# Altium schematic symbol library jlcpcb_2025_04_capacitors_extended_0805.schlib: 3281 symbols (part 14 of 18)
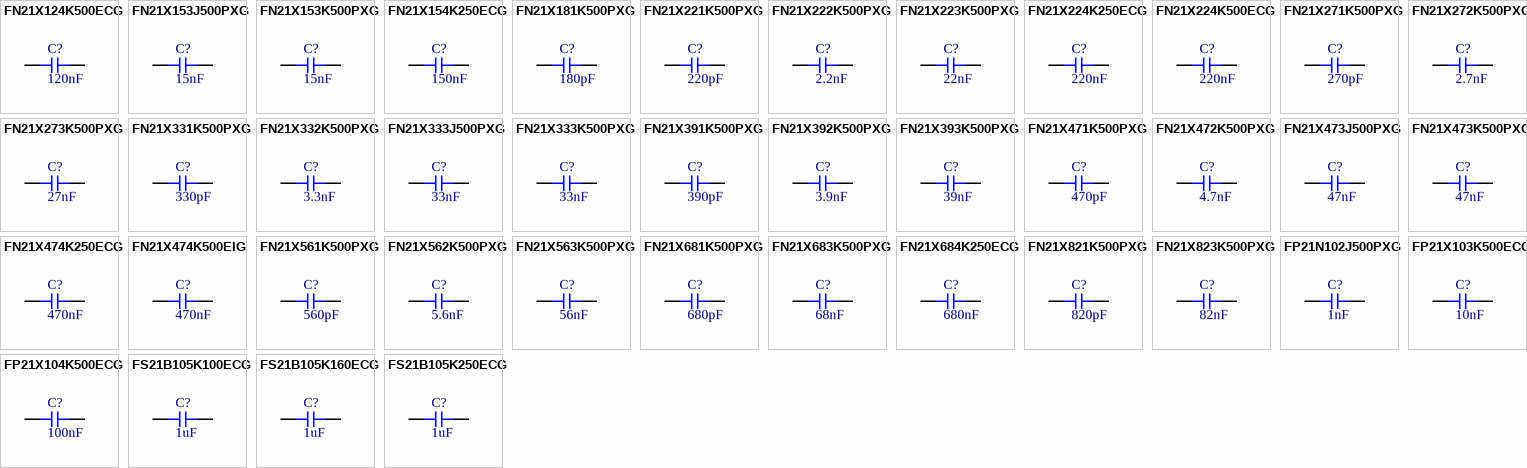
[diagram p95: symbols FN21X124K500ECG to FS21B105K250ECG]

## FN21X821K500PXG
designator C?  Capacitance: 820pF  (hidden comment: *)
Capacitor, Ceramic (MLCC), 820pF, ±10%, 50V, X7R, ±10%, SMD 0805; Manufacturer: PSA(Prosperity Dielectrics); Manufacturer Part Number: FN21X821K500PXG; Package Size: 0805; JLCPCB Basic Part: No; JLCPCB Part Number: C565627; Supplier 1: LCSC; Category: Capacitors - MLCC; Supplier Part Number 1: C565627; Tolerance: ±10%; Voltage Rating: 50V; Temperature Coefficient: X7R; RoHS: Yes; ComponentLink1Description: Datasheet; ComponentLink1URL: https://wmsc.lcsc.com/wmsc/upload/file/pdf/v2/lcsc/2304140030_PSA-Prosperity-Dielectrics-FN21X821K500PXG_C565627.pdf; ComponentLink2Description: JLCPCB Part URL; ComponentLink2URL: https://jlcpcb.com/partdetail/C565627; ComponentLink3Description: LCSC Part URL; ComponentLink3URL: https://lcsc.com/product-detail/Multilayer-Ceramic-Capacitors-MLCC---SMD-SMT_PSAProsperity-Dielectrics-PSAProsperity-Dielectrics-FN21X821K500PXG_C565627.html
footprint CAP-0805 (0805 (2012M) Capacitor)
pins: 1, 2

## FN21X823K500PXG
designator C?  Capacitance: 82nF  (hidden comment: *)
Capacitor, Ceramic (MLCC), 82nF, ±10%, 50V, X7R, ±10%, SMD 0805; Manufacturer: PSA(Prosperity Dielectrics); Manufacturer Part Number: FN21X823K500PXG; Package Size: 0805; JLCPCB Basic Part: No; JLCPCB Part Number: C565629; Supplier 1: LCSC; Category: Capacitors - MLCC; Supplier Part Number 1: C565629; Tolerance: ±10%; Voltage Rating: 50V; Temperature Coefficient: X7R; RoHS: Yes; ComponentLink1Description: Datasheet; ComponentLink1URL: https://wmsc.lcsc.com/wmsc/upload/file/pdf/v2/lcsc/2304140030_PSA-Prosperity-Dielectrics-FN21X823K500PXG_C565629.pdf; ComponentLink2Description: JLCPCB Part URL; ComponentLink2URL: https://jlcpcb.com/partdetail/C565629; ComponentLink3Description: LCSC Part URL; ComponentLink3URL: https://lcsc.com/product-detail/Multilayer-Ceramic-Capacitors-MLCC---SMD-SMT_PSAProsperity-Dielectrics-PSAProsperity-Dielectrics-FN21X823K500PXG_C565629.html
footprint CAP-0805 (0805 (2012M) Capacitor)
pins: 1, 2

## FP21N102J500PXG
designator C?  Capacitance: 1nF  (hidden comment: *)
Capacitor, Ceramic (MLCC), 1nF, ±5%, 50V, C0G, ±5%, SMD 0805; Manufacturer: PSA(Prosperity Dielectrics); Manufacturer Part Number: FP21N102J500PXG; Package Size: 0805; JLCPCB Basic Part: No; JLCPCB Part Number: C525320; Supplier 1: LCSC; Category: Capacitors - MLCC; Supplier Part Number 1: C525320; Tolerance: ±5%; Voltage Rating: 50V; Temperature Coefficient: C0G; RoHS: Yes; ComponentLink1Description: Datasheet; ComponentLink1URL: https://wmsc.lcsc.com/wmsc/upload/file/pdf/v2/lcsc/2304140030_PSA-Prosperity-Dielectrics-FP21N102J500PXG_C525320.pdf; ComponentLink2Description: JLCPCB Part URL; ComponentLink2URL: https://jlcpcb.com/partdetail/C525320; ComponentLink3Description: LCSC Part URL; ComponentLink3URL: https://lcsc.com/product-detail/Multilayer-Ceramic-Capacitors-MLCC---SMD-SMT_PSAProsperity-Dielectrics-PSAProsperity-Dielectrics-FP21N102J500PXG_C525320.html
footprint CAP-0805 (0805 (2012M) Capacitor)
pins: 1, 2

## FP21X103K500ECG
designator C?  Capacitance: 10nF  (hidden comment: *)
Capacitor, Ceramic (MLCC), 10nF, ±10%, 50V, X7R, ±10%, SMD 0805; Manufacturer: PSA(Prosperity Dielectrics); Manufacturer Part Number: FP21X103K500ECG; Package Size: 0805; JLCPCB Basic Part: No; JLCPCB Part Number: C2929180; Supplier 1: LCSC; Category: Capacitors - MLCC; Supplier Part Number 1: C2929180; Tolerance: ±10%; Voltage Rating: 50V; Temperature Coefficient: X7R; RoHS: Yes; ComponentLink1Description: Datasheet; ComponentLink1URL: https://wmsc.lcsc.com/wmsc/upload/file/pdf/v2/lcsc/2201121400_PSA-Prosperity-Dielectrics-FP21X103K500ECG_C2929180.pdf; ComponentLink2Description: JLCPCB Part URL; ComponentLink2URL: https://jlcpcb.com/partdetail/C2929180; ComponentLink3Description: LCSC Part URL; ComponentLink3URL: https://lcsc.com/product-detail/Multilayer-Ceramic-Capacitors-MLCC---SMD-SMT_PSAProsperity-Dielectrics-PSAProsperity-Dielectrics-FP21X103K500ECG_C2929180.html
footprint CAP-0805 (0805 (2012M) Capacitor)
pins: 1, 2

## FP21X104K500ECG
designator C?  Capacitance: 100nF  (hidden comment: *)
Capacitor, Ceramic (MLCC), 100nF, ±10%, 50V, X7R, ±10%, SMD 0805; Manufacturer: PSA(Prosperity Dielectrics); Manufacturer Part Number: FP21X104K500ECG; Package Size: 0805; JLCPCB Basic Part: No; JLCPCB Part Number: C2929181; Supplier 1: LCSC; Category: Capacitors - MLCC; Supplier Part Number 1: C2929181; Tolerance: ±10%; Voltage Rating: 50V; Temperature Coefficient: X7R; RoHS: Yes; ComponentLink1Description: Datasheet; ComponentLink1URL: https://wmsc.lcsc.com/wmsc/upload/file/pdf/v2/lcsc/2201121400_PSA-Prosperity-Dielectrics-FP21X104K500ECG_C2929181.pdf; ComponentLink2Description: JLCPCB Part URL; ComponentLink2URL: https://jlcpcb.com/partdetail/C2929181; ComponentLink3Description: LCSC Part URL; ComponentLink3URL: https://lcsc.com/product-detail/Multilayer-Ceramic-Capacitors-MLCC---SMD-SMT_PSAProsperity-Dielectrics-PSAProsperity-Dielectrics-FP21X104K500ECG_C2929181.html
footprint CAP-0805 (0805 (2012M) Capacitor)
pins: 1, 2

## FS21B105K100ECG
designator C?  Capacitance: 1uF  (hidden comment: *)
Capacitor, Ceramic (MLCC), 1uF, ±10%, 10V, X5R, ±10%, SMD 0805; Manufacturer: PSA(Prosperity Dielectrics); Manufacturer Part Number: FS21B105K100ECG; Package Size: 0805; JLCPCB Basic Part: No; JLCPCB Part Number: C525336; Supplier 1: LCSC; Category: Capacitors - MLCC; Supplier Part Number 1: C525336; Tolerance: ±10%; Voltage Rating: 10V; Temperature Coefficient: X5R; RoHS: Yes; ComponentLink1Description: Datasheet; ComponentLink1URL: https://wmsc.lcsc.com/wmsc/upload/file/pdf/v2/lcsc/2304140030_PSA-Prosperity-Dielectrics-FS21B105K100ECG_C525336.pdf; ComponentLink2Description: JLCPCB Part URL; ComponentLink2URL: https://jlcpcb.com/partdetail/C525336; ComponentLink3Description: LCSC Part URL; ComponentLink3URL: https://lcsc.com/product-detail/Multilayer-Ceramic-Capacitors-MLCC---SMD-SMT_PSAProsperity-Dielectrics-PSAProsperity-Dielectrics-FS21B105K100ECG_C525336.html
footprint CAP-0805 (0805 (2012M) Capacitor)
pins: 1, 2

## FS21B105K160ECG
designator C?  Capacitance: 1uF  (hidden comment: *)
Capacitor, Ceramic (MLCC), 1uF, ±10%, 16V, X5R, ±10%, SMD 0805; Manufacturer: PSA(Prosperity Dielectrics); Manufacturer Part Number: FS21B105K160ECG; Package Size: 0805; JLCPCB Basic Part: No; JLCPCB Part Number: C525337; Supplier 1: LCSC; Category: Capacitors - MLCC; Supplier Part Number 1: C525337; Tolerance: ±10%; Voltage Rating: 16V; Temperature Coefficient: X5R; RoHS: Yes; ComponentLink1Description: Datasheet; ComponentLink1URL: https://wmsc.lcsc.com/wmsc/upload/file/pdf/v2/lcsc/2304140030_PSA-Prosperity-Dielectrics-FS21B105K160ECG_C525337.pdf; ComponentLink2Description: JLCPCB Part URL; ComponentLink2URL: https://jlcpcb.com/partdetail/C525337; ComponentLink3Description: LCSC Part URL; ComponentLink3URL: https://lcsc.com/product-detail/Multilayer-Ceramic-Capacitors-MLCC---SMD-SMT_PSAProsperity-Dielectrics-PSAProsperity-Dielectrics-FS21B105K160ECG_C525337.html
footprint CAP-0805 (0805 (2012M) Capacitor)
pins: 1, 2

## FS21B105K250ECG
designator C?  Capacitance: 1uF  (hidden comment: *)
Capacitor, Ceramic (MLCC), 1uF, ±10%, 25V, X5R, ±10%, SMD 0805; Manufacturer: PSA(Prosperity Dielectrics); Manufacturer Part Number: FS21B105K250ECG; Package Size: 0805; JLCPCB Basic Part: No; JLCPCB Part Number: C525338; Supplier 1: LCSC; Category: Capacitors - MLCC; Supplier Part Number 1: C525338; Tolerance: ±10%; Voltage Rating: 25V; Temperature Coefficient: X5R; RoHS: Yes; ComponentLink1Description: Datasheet; ComponentLink1URL: https://wmsc.lcsc.com/wmsc/upload/file/pdf/v2/lcsc/2304140030_PSA-Prosperity-Dielectrics-FS21B105K250ECG_C525338.pdf; ComponentLink2Description: JLCPCB Part URL; ComponentLink2URL: https://jlcpcb.com/partdetail/C525338; ComponentLink3Description: LCSC Part URL; ComponentLink3URL: https://lcsc.com/product-detail/Multilayer-Ceramic-Capacitors-MLCC---SMD-SMT_PSAProsperity-Dielectrics-PSAProsperity-Dielectrics-FS21B105K250ECG_C525338.html
footprint CAP-0805 (0805 (2012M) Capacitor)
pins: 1, 2

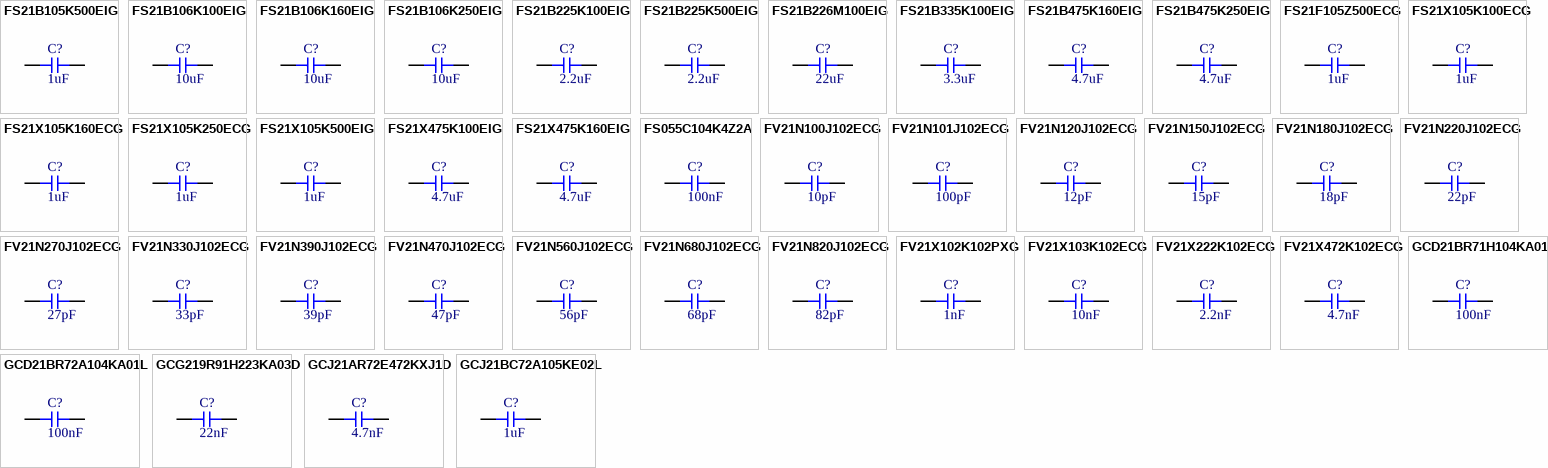
[diagram p60: symbols FS21B105K500EIG to GCJ21BC72A105KE02L]

## FS21B105K500EIG
designator C?  Capacitance: 1uF  (hidden comment: *)
Capacitor, Ceramic (MLCC), 1uF, ±10%, 50V, X5R, ±10%, SMD 0805; Manufacturer: PSA(Prosperity Dielectrics); Manufacturer Part Number: FS21B105K500EIG; Package Size: 0805; JLCPCB Basic Part: No; JLCPCB Part Number: C525339; Supplier 1: LCSC; Category: Capacitors - MLCC; Supplier Part Number 1: C525339; Tolerance: ±10%; Voltage Rating: 50V; Temperature Coefficient: X5R; RoHS: Yes; ComponentLink1Description: Datasheet; ComponentLink1URL: https://wmsc.lcsc.com/wmsc/upload/file/pdf/v2/lcsc/2304140030_PSA-Prosperity-Dielectrics-FS21B105K500EIG_C525339.pdf; ComponentLink2Description: JLCPCB Part URL; ComponentLink2URL: https://jlcpcb.com/partdetail/C525339; ComponentLink3Description: LCSC Part URL; ComponentLink3URL: https://lcsc.com/product-detail/Multilayer-Ceramic-Capacitors-MLCC---SMD-SMT_PSAProsperity-Dielectrics-PSAProsperity-Dielectrics-FS21B105K500EIG_C525339.html
footprint CAP-0805 (0805 (2012M) Capacitor)
pins: 1, 2

## FS21B106K100EIG
designator C?  Capacitance: 10uF  (hidden comment: *)
Capacitor, Ceramic (MLCC), 10uF, 10V, X5R, SMD 0805; Manufacturer: PSA(Prosperity Dielectrics); Manufacturer Part Number: FS21B106K100EIG; Package Size: 0805; JLCPCB Basic Part: No; JLCPCB Part Number: C2874755; Supplier 1: LCSC; Category: Capacitors - MLCC; Supplier Part Number 1: C2874755; Voltage Rating: 10V; Temperature Coefficient: X5R; RoHS: Yes; ComponentLink1Description: Datasheet; ComponentLink1URL: https://wmsc.lcsc.com/wmsc/upload/file/pdf/v2/lcsc/2108150330_PSA-Prosperity-Dielectrics-FS21B106K100EIG_C2874755.pdf; ComponentLink2Description: JLCPCB Part URL; ComponentLink2URL: https://jlcpcb.com/partdetail/C2874755; ComponentLink3Description: LCSC Part URL; ComponentLink3URL: https://lcsc.com/product-detail/Multilayer-Ceramic-Capacitors-MLCC---SMD-SMT_PSAProsperity-Dielectrics-PSAProsperity-Dielectrics-FS21B106K100EIG_C2874755.html
footprint CAP-0805 (0805 (2012M) Capacitor)
pins: 1, 2

## FS21B106K160EIG
designator C?  Capacitance: 10uF  (hidden comment: *)
Capacitor, Ceramic (MLCC), 10uF, 16V, X5R, SMD 0805; Manufacturer: PSA(Prosperity Dielectrics); Manufacturer Part Number: FS21B106K160EIG; Package Size: 0805; JLCPCB Basic Part: No; JLCPCB Part Number: C2874756; Supplier 1: LCSC; Category: Capacitors - MLCC; Supplier Part Number 1: C2874756; Voltage Rating: 16V; Temperature Coefficient: X5R; RoHS: Yes; ComponentLink1Description: Datasheet; ComponentLink1URL: https://wmsc.lcsc.com/wmsc/upload/file/pdf/v2/lcsc/2108150330_PSA-Prosperity-Dielectrics-FS21B106K160EIG_C2874756.pdf; ComponentLink2Description: JLCPCB Part URL; ComponentLink2URL: https://jlcpcb.com/partdetail/C2874756; ComponentLink3Description: LCSC Part URL; ComponentLink3URL: https://lcsc.com/product-detail/Multilayer-Ceramic-Capacitors-MLCC---SMD-SMT_PSAProsperity-Dielectrics-PSAProsperity-Dielectrics-FS21B106K160EIG_C2874756.html
footprint CAP-0805 (0805 (2012M) Capacitor)
pins: 1, 2

## FS21B106K250EIG
designator C?  Capacitance: 10uF  (hidden comment: *)
Capacitor, Ceramic (MLCC), 10uF, ±10%, 25V, X5R, ±10%, SMD 0805; Manufacturer: PSA(Prosperity Dielectrics); Manufacturer Part Number: FS21B106K250EIG; Package Size: 0805; JLCPCB Basic Part: No; JLCPCB Part Number: C843602; Supplier 1: LCSC; Category: Capacitors - MLCC; Supplier Part Number 1: C843602; Tolerance: ±10%; Voltage Rating: 25V; Temperature Coefficient: X5R; RoHS: Yes; ComponentLink1Description: Datasheet; ComponentLink1URL: https://wmsc.lcsc.com/wmsc/upload/file/pdf/v2/lcsc/2304140030_PSA-Prosperity-Dielectrics-FS21B106K250EIG_C843602.pdf; ComponentLink2Description: JLCPCB Part URL; ComponentLink2URL: https://jlcpcb.com/partdetail/C843602; ComponentLink3Description: LCSC Part URL; ComponentLink3URL: https://lcsc.com/product-detail/Multilayer-Ceramic-Capacitors-MLCC---SMD-SMT_PSAProsperity-Dielectrics-PSAProsperity-Dielectrics-FS21B106K250EIG_C843602.html
footprint CAP-0805 (0805 (2012M) Capacitor)
pins: 1, 2

## FS21B225K100EIG
designator C?  Capacitance: 2.2uF  (hidden comment: *)
Capacitor, Ceramic (MLCC), 2.2uF, ±10%, 10V, X5R, ±10%, SMD 0805; Manufacturer: PSA(Prosperity Dielectrics); Manufacturer Part Number: FS21B225K100EIG; Package Size: 0805; JLCPCB Basic Part: No; JLCPCB Part Number: C525340; Supplier 1: LCSC; Category: Capacitors - MLCC; Supplier Part Number 1: C525340; Tolerance: ±10%; Voltage Rating: 10V; Temperature Coefficient: X5R; RoHS: Yes; ComponentLink1Description: Datasheet; ComponentLink1URL: https://wmsc.lcsc.com/wmsc/upload/file/pdf/v2/lcsc/2304140030_PSA-Prosperity-Dielectrics-FS21B225K100EIG_C525340.pdf; ComponentLink2Description: JLCPCB Part URL; ComponentLink2URL: https://jlcpcb.com/partdetail/C525340; ComponentLink3Description: LCSC Part URL; ComponentLink3URL: https://lcsc.com/product-detail/Multilayer-Ceramic-Capacitors-MLCC---SMD-SMT_PSAProsperity-Dielectrics-PSAProsperity-Dielectrics-FS21B225K100EIG_C525340.html
footprint CAP-0805 (0805 (2012M) Capacitor)
pins: 1, 2

## FS21B225K500EIG
designator C?  Capacitance: 2.2uF  (hidden comment: *)
Capacitor, Ceramic (MLCC), 2.2uF, ±10%, 50V, X5R, ±10%, SMD 0805; Manufacturer: PSA(Prosperity Dielectrics); Manufacturer Part Number: FS21B225K500EIG; Package Size: 0805; JLCPCB Basic Part: No; JLCPCB Part Number: C2874758; Supplier 1: LCSC; Category: Capacitors - MLCC; Supplier Part Number 1: C2874758; Tolerance: ±10%; Voltage Rating: 50V; Temperature Coefficient: X5R; RoHS: Yes; ComponentLink1Description: Datasheet; ComponentLink1URL: https://wmsc.lcsc.com/wmsc/upload/file/pdf/v2/lcsc/2108150330_PSA-Prosperity-Dielectrics-FS21B225K500EIG_C2874758.pdf; ComponentLink2Description: JLCPCB Part URL; ComponentLink2URL: https://jlcpcb.com/partdetail/C2874758; ComponentLink3Description: LCSC Part URL; ComponentLink3URL: https://lcsc.com/product-detail/Multilayer-Ceramic-Capacitors-MLCC---SMD-SMT_PSAProsperity-Dielectrics-PSAProsperity-Dielectrics-FS21B225K500EIG_C2874758.html
footprint CAP-0805 (0805 (2012M) Capacitor)
pins: 1, 2

## FS21B226M100EIG
designator C?  Capacitance: 22uF  (hidden comment: *)
Capacitor, Ceramic (MLCC), 22uF, ±20%, 10V, ±20%, SMD 0805; Manufacturer: PSA(Prosperity Dielectrics); Manufacturer Part Number: FS21B226M100EIG; Package Size: 0805; JLCPCB Basic Part: No; JLCPCB Part Number: C2836877; Supplier 1: LCSC; Category: Capacitors - MLCC; Supplier Part Number 1: C2836877; Tolerance: ±20%; Voltage Rating: 10V; RoHS: Yes; ComponentLink1Description: Datasheet; ComponentLink1URL: https://wmsc.lcsc.com/wmsc/upload/file/pdf/v2/lcsc/2304140030_PSA-Prosperity-Dielectrics-FS21B226M100EIG_C2836877.pdf; ComponentLink2Description: JLCPCB Part URL; ComponentLink2URL: https://jlcpcb.com/partdetail/C2836877; ComponentLink3Description: LCSC Part URL; ComponentLink3URL: https://lcsc.com/product-detail/Multilayer-Ceramic-Capacitors-MLCC---SMD-SMT_PSAProsperity-Dielectrics-PSAProsperity-Dielectrics-FS21B226M100EIG_C2836877.html
footprint CAP-0805 (0805 (2012M) Capacitor)
pins: 1, 2

## FS21B335K100EIG
designator C?  Capacitance: 3.3uF  (hidden comment: *)
Capacitor, Ceramic (MLCC), 3.3uF, ±10%, 10V, ±10%, SMD 0805; Manufacturer: PSA(Prosperity Dielectrics); Manufacturer Part Number: FS21B335K100EIG; Package Size: 0805; JLCPCB Basic Part: No; JLCPCB Part Number: C146188; Supplier 1: LCSC; Category: Capacitors - MLCC; Supplier Part Number 1: C146188; Tolerance: ±10%; Voltage Rating: 10V; RoHS: Yes; ComponentLink1Description: Datasheet; ComponentLink1URL: https://wmsc.lcsc.com/wmsc/upload/file/pdf/v2/lcsc/2304140030_PSA-Prosperity-Dielectrics-FS21B335K100EIG_C146188.pdf; ComponentLink2Description: JLCPCB Part URL; ComponentLink2URL: https://jlcpcb.com/partdetail/C146188; ComponentLink3Description: LCSC Part URL; ComponentLink3URL: https://lcsc.com/product-detail/Multilayer-Ceramic-Capacitors-MLCC---SMD-SMT_PSAProsperity-Dielectrics-PSAProsperity-Dielectrics-FS21B335K100EIG_C146188.html
footprint CAP-0805 (0805 (2012M) Capacitor)
pins: 1, 2

## FS21B475K160EIG
designator C?  Capacitance: 4.7uF  (hidden comment: *)
Capacitor, Ceramic (MLCC), 4.7uF, ±10%, 16V, X5R, ±10%, SMD 0805; Manufacturer: PSA(Prosperity Dielectrics); Manufacturer Part Number: FS21B475K160EIG; Package Size: 0805; JLCPCB Basic Part: No; JLCPCB Part Number: C2929196; Supplier 1: LCSC; Category: Capacitors - MLCC; Supplier Part Number 1: C2929196; Tolerance: ±10%; Voltage Rating: 16V; Temperature Coefficient: X5R; RoHS: Yes; ComponentLink1Description: Datasheet; ComponentLink1URL: https://wmsc.lcsc.com/wmsc/upload/file/pdf/v2/lcsc/2201121400_PSA-Prosperity-Dielectrics-FS21B475K160EIG_C2929196.pdf; ComponentLink2Description: JLCPCB Part URL; ComponentLink2URL: https://jlcpcb.com/partdetail/C2929196; ComponentLink3Description: LCSC Part URL; ComponentLink3URL: https://lcsc.com/product-detail/Multilayer-Ceramic-Capacitors-MLCC---SMD-SMT_PSAProsperity-Dielectrics-PSAProsperity-Dielectrics-FS21B475K160EIG_C2929196.html
footprint CAP-0805 (0805 (2012M) Capacitor)
pins: 1, 2

## FS21B475K250EIG
designator C?  Capacitance: 4.7uF  (hidden comment: *)
Capacitor, Ceramic (MLCC), 4.7uF, ±10%, 25V, X5R, ±10%, SMD 0805; Manufacturer: PSA(Prosperity Dielectrics); Manufacturer Part Number: FS21B475K250EIG; Package Size: 0805; JLCPCB Basic Part: No; JLCPCB Part Number: C146189; Supplier 1: LCSC; Category: Capacitors - MLCC; Supplier Part Number 1: C146189; Tolerance: ±10%; Voltage Rating: 25V; Temperature Coefficient: X5R; RoHS: Yes; ComponentLink1Description: Datasheet; ComponentLink1URL: https://wmsc.lcsc.com/wmsc/upload/file/pdf/v2/lcsc/2304140030_PSA-Prosperity-Dielectrics-FS21B475K250EIG_C146189.pdf; ComponentLink2Description: JLCPCB Part URL; ComponentLink2URL: https://jlcpcb.com/partdetail/C146189; ComponentLink3Description: LCSC Part URL; ComponentLink3URL: https://lcsc.com/product-detail/Multilayer-Ceramic-Capacitors-MLCC---SMD-SMT_PSAProsperity-Dielectrics-PSAProsperity-Dielectrics-FS21B475K250EIG_C146189.html
footprint CAP-0805 (0805 (2012M) Capacitor)
pins: 1, 2

## FS21F105Z500ECG
designator C?  Capacitance: 1uF  (hidden comment: *)
Capacitor, Ceramic (MLCC), 1uF, 50V, Y5V, SMD 0805; Manufacturer: PSA(Prosperity Dielectrics); Manufacturer Part Number: FS21F105Z500ECG; Temperature Rating: -20%~+80%; Package Size: 0805; JLCPCB Basic Part: No; JLCPCB Part Number: C525341; Supplier 1: LCSC; Category: Capacitors - MLCC; Supplier Part Number 1: C525341; Voltage Rating: 50V; Temperature Coefficient: Y5V; RoHS: Yes; ComponentLink1Description: Datasheet; ComponentLink1URL: https://wmsc.lcsc.com/wmsc/upload/file/pdf/v2/lcsc/2304140030_PSA-Prosperity-Dielectrics-FS21F105Z500ECG_C525341.pdf; ComponentLink2Description: JLCPCB Part URL; ComponentLink2URL: https://jlcpcb.com/partdetail/C525341; ComponentLink3Description: LCSC Part URL; ComponentLink3URL: https://lcsc.com/product-detail/Multilayer-Ceramic-Capacitors-MLCC---SMD-SMT_PSAProsperity-Dielectrics-PSAProsperity-Dielectrics-FS21F105Z500ECG_C525341.html
footprint CAP-0805 (0805 (2012M) Capacitor)
pins: 1, 2

## FS21X105K100ECG
designator C?  Capacitance: 1uF  (hidden comment: *)
Capacitor, Ceramic (MLCC), 1uF, ±10%, 10V, X7R, ±10%, SMD 0805; Manufacturer: PSA(Prosperity Dielectrics); Manufacturer Part Number: FS21X105K100ECG; Package Size: 0805; JLCPCB Basic Part: No; JLCPCB Part Number: C525342; Supplier 1: LCSC; Category: Capacitors - MLCC; Supplier Part Number 1: C525342; Tolerance: ±10%; Voltage Rating: 10V; Temperature Coefficient: X7R; RoHS: Yes; ComponentLink1Description: Datasheet; ComponentLink1URL: https://wmsc.lcsc.com/wmsc/upload/file/pdf/v2/lcsc/2304140030_PSA-Prosperity-Dielectrics-FS21X105K100ECG_C525342.pdf; ComponentLink2Description: JLCPCB Part URL; ComponentLink2URL: https://jlcpcb.com/partdetail/C525342; ComponentLink3Description: LCSC Part URL; ComponentLink3URL: https://lcsc.com/product-detail/Multilayer-Ceramic-Capacitors-MLCC---SMD-SMT_PSAProsperity-Dielectrics-PSAProsperity-Dielectrics-FS21X105K100ECG_C525342.html
footprint CAP-0805 (0805 (2012M) Capacitor)
pins: 1, 2

## FS21X105K160ECG
designator C?  Capacitance: 1uF  (hidden comment: *)
Capacitor, Ceramic (MLCC), 1uF, ±10%, 16V, X7R, ±10%, SMD 0805; Manufacturer: PSA(Prosperity Dielectrics); Manufacturer Part Number: FS21X105K160ECG; Package Size: 0805; JLCPCB Basic Part: No; JLCPCB Part Number: C525343; Supplier 1: LCSC; Category: Capacitors - MLCC; Supplier Part Number 1: C525343; Tolerance: ±10%; Voltage Rating: 16V; Temperature Coefficient: X7R; RoHS: Yes; ComponentLink1Description: Datasheet; ComponentLink1URL: https://wmsc.lcsc.com/wmsc/upload/file/pdf/v2/lcsc/2304140030_PSA-Prosperity-Dielectrics-FS21X105K160ECG_C525343.pdf; ComponentLink2Description: JLCPCB Part URL; ComponentLink2URL: https://jlcpcb.com/partdetail/C525343; ComponentLink3Description: LCSC Part URL; ComponentLink3URL: https://lcsc.com/product-detail/Multilayer-Ceramic-Capacitors-MLCC---SMD-SMT_PSAProsperity-Dielectrics-PSAProsperity-Dielectrics-FS21X105K160ECG_C525343.html
footprint CAP-0805 (0805 (2012M) Capacitor)
pins: 1, 2

## FS21X105K250ECG
designator C?  Capacitance: 1uF  (hidden comment: *)
Capacitor, Ceramic (MLCC), 1uF, ±10%, 25V, X7R, ±10%, SMD 0805; Manufacturer: PSA(Prosperity Dielectrics); Manufacturer Part Number: FS21X105K250ECG; Package Size: 0805; JLCPCB Basic Part: No; JLCPCB Part Number: C146681; Supplier 1: LCSC; Category: Capacitors - MLCC; Supplier Part Number 1: C146681; Tolerance: ±10%; Voltage Rating: 25V; Temperature Coefficient: X7R; RoHS: Yes; ComponentLink1Description: Datasheet; ComponentLink1URL: https://wmsc.lcsc.com/wmsc/upload/file/pdf/v2/lcsc/2304140030_PSA-Prosperity-Dielectrics-FS21X105K250ECG_C146681.pdf; ComponentLink2Description: JLCPCB Part URL; ComponentLink2URL: https://jlcpcb.com/partdetail/C146681; ComponentLink3Description: LCSC Part URL; ComponentLink3URL: https://lcsc.com/product-detail/Multilayer-Ceramic-Capacitors-MLCC---SMD-SMT_PSAProsperity-Dielectrics-PSAProsperity-Dielectrics-FS21X105K250ECG_C146681.html
footprint CAP-0805 (0805 (2012M) Capacitor)
pins: 1, 2

## FS21X105K500EIG
designator C?  Capacitance: 1uF  (hidden comment: *)
Capacitor, Ceramic (MLCC), 1uF, ±10%, 50V, X7R, ±10%, SMD 0805; Manufacturer: PSA(Prosperity Dielectrics); Manufacturer Part Number: FS21X105K500EIG; Package Size: 0805; JLCPCB Basic Part: No; JLCPCB Part Number: C525344; Supplier 1: LCSC; Category: Capacitors - MLCC; Supplier Part Number 1: C525344; Tolerance: ±10%; Voltage Rating: 50V; Temperature Coefficient: X7R; RoHS: Yes; ComponentLink1Description: Datasheet; ComponentLink1URL: https://wmsc.lcsc.com/wmsc/upload/file/pdf/v2/lcsc/2304140030_PSA-Prosperity-Dielectrics-FS21X105K500EIG_C525344.pdf; ComponentLink2Description: JLCPCB Part URL; ComponentLink2URL: https://jlcpcb.com/partdetail/C525344; ComponentLink3Description: LCSC Part URL; ComponentLink3URL: https://lcsc.com/product-detail/Multilayer-Ceramic-Capacitors-MLCC---SMD-SMT_PSAProsperity-Dielectrics-PSAProsperity-Dielectrics-FS21X105K500EIG_C525344.html
footprint CAP-0805 (0805 (2012M) Capacitor)
pins: 1, 2

## FS21X475K100EIG
designator C?  Capacitance: 4.7uF  (hidden comment: *)
Capacitor, Ceramic (MLCC), 4.7uF, ±10%, 10V, X7R, ±10%, SMD 0805; Manufacturer: PSA(Prosperity Dielectrics); Manufacturer Part Number: FS21X475K100EIG; Package Size: 0805; JLCPCB Basic Part: No; JLCPCB Part Number: C525345; Supplier 1: LCSC; Category: Capacitors - MLCC; Supplier Part Number 1: C525345; Tolerance: ±10%; Voltage Rating: 10V; Temperature Coefficient: X7R; RoHS: Yes; ComponentLink1Description: Datasheet; ComponentLink1URL: https://wmsc.lcsc.com/wmsc/upload/file/pdf/v2/lcsc/2304140030_PSA-Prosperity-Dielectrics-FS21X475K100EIG_C525345.pdf; ComponentLink2Description: JLCPCB Part URL; ComponentLink2URL: https://jlcpcb.com/partdetail/C525345; ComponentLink3Description: LCSC Part URL; ComponentLink3URL: https://lcsc.com/product-detail/Multilayer-Ceramic-Capacitors-MLCC---SMD-SMT_PSAProsperity-Dielectrics-PSAProsperity-Dielectrics-FS21X475K100EIG_C525345.html
footprint CAP-0805 (0805 (2012M) Capacitor)
pins: 1, 2

## FS21X475K160EIG
designator C?  Capacitance: 4.7uF  (hidden comment: *)
Capacitor, Ceramic (MLCC), 4.7uF, ±10%, 16V, X7R, ±10%, SMD 0805; Manufacturer: PSA(Prosperity Dielectrics); Manufacturer Part Number: FS21X475K160EIG; Package Size: 0805; JLCPCB Basic Part: No; JLCPCB Part Number: C2929197; Supplier 1: LCSC; Category: Capacitors - MLCC; Supplier Part Number 1: C2929197; Tolerance: ±10%; Voltage Rating: 16V; Temperature Coefficient: X7R; RoHS: Yes; ComponentLink1Description: Datasheet; ComponentLink1URL: https://wmsc.lcsc.com/wmsc/upload/file/pdf/v2/lcsc/2201121400_PSA-Prosperity-Dielectrics-FS21X475K160EIG_C2929197.pdf; ComponentLink2Description: JLCPCB Part URL; ComponentLink2URL: https://jlcpcb.com/partdetail/C2929197; ComponentLink3Description: LCSC Part URL; ComponentLink3URL: https://lcsc.com/product-detail/Multilayer-Ceramic-Capacitors-MLCC---SMD-SMT_PSAProsperity-Dielectrics-PSAProsperity-Dielectrics-FS21X475K160EIG_C2929197.html
footprint CAP-0805 (0805 (2012M) Capacitor)
pins: 1, 2

## FS055C104K4Z2A
designator C?  Capacitance: 100nF  (hidden comment: *)
Capacitor, Ceramic (MLCC), 100nF, ±10%, 50V, X7R, ±10%, SMD 0805; Manufacturer: AVX; Manufacturer Part Number: FS055C104K4Z2A; Package Size: 0805; JLCPCB Basic Part: No; JLCPCB Part Number: C444732; Supplier 1: LCSC; Category: Capacitors - MLCC; Supplier Part Number 1: C444732; Tolerance: ±10%; Voltage Rating: 50V; Temperature Coefficient: X7R; RoHS: Yes; ComponentLink1Description: Datasheet; ComponentLink1URL: https://wmsc.lcsc.com/wmsc/upload/file/pdf/v2/lcsc/2304140030_Kyocera-AVX-FS055C104K4Z2A_C444732.pdf; ComponentLink2Description: JLCPCB Part URL; ComponentLink2URL: https://jlcpcb.com/partdetail/C444732; ComponentLink3Description: LCSC Part URL; ComponentLink3URL: https://lcsc.com/product-detail/Multilayer-Ceramic-Capacitors-MLCC---SMD-SMT_Kyocera-AVX-Kyocera-AVX-FS055C104K4Z2A_C444732.html
footprint CAP-0805 (0805 (2012M) Capacitor)
pins: 1, 2

## FV21N100J102ECG
designator C?  Capacitance: 10pF  (hidden comment: *)
Capacitor, Ceramic (MLCC), 10pF, ±5%, 1kV, C0G, ±5%, SMD 0805; Manufacturer: PSA(Prosperity Dielectrics); Manufacturer Part Number: FV21N100J102ECG; Package Size: 0805; JLCPCB Basic Part: No; JLCPCB Part Number: C3033315; Supplier 1: LCSC; Category: Capacitors - MLCC; Supplier Part Number 1: C3033315; Tolerance: ±5%; Voltage Rating: 1kV; Temperature Coefficient: C0G; RoHS: Yes; ComponentLink1Description: Datasheet; ComponentLink1URL: https://wmsc.lcsc.com/wmsc/upload/file/pdf/v2/lcsc/2206071616_PSA-Prosperity-Dielectrics-FV21N100J102ECG_C3033315.pdf; ComponentLink2Description: JLCPCB Part URL; ComponentLink2URL: https://jlcpcb.com/partdetail/C3033315; ComponentLink3Description: LCSC Part URL; ComponentLink3URL: https://lcsc.com/product-detail/Multilayer-Ceramic-Capacitors-MLCC---SMD-SMT_PSAProsperity-Dielectrics-PSAProsperity-Dielectrics-FV21N100J102ECG_C3033315.html
footprint CAP-0805 (0805 (2012M) Capacitor)
pins: 1, 2

## FV21N101J102ECG
designator C?  Capacitance: 100pF  (hidden comment: *)
Capacitor, Ceramic (MLCC), 100pF, ±5%, 1kV, C0G, ±5%, SMD 0805; Manufacturer: PSA(Prosperity Dielectrics); Manufacturer Part Number: FV21N101J102ECG; Package Size: 0805; JLCPCB Basic Part: No; JLCPCB Part Number: C565670; Supplier 1: LCSC; Category: Capacitors - MLCC; Supplier Part Number 1: C565670; Tolerance: ±5%; Voltage Rating: 1kV; Temperature Coefficient: C0G; RoHS: Yes; ComponentLink1Description: Datasheet; ComponentLink1URL: https://wmsc.lcsc.com/wmsc/upload/file/pdf/v2/lcsc/2304140030_PSA-Prosperity-Dielectrics-FV21N101J102ECG_C565670.pdf; ComponentLink2Description: JLCPCB Part URL; ComponentLink2URL: https://jlcpcb.com/partdetail/C565670; ComponentLink3Description: LCSC Part URL; ComponentLink3URL: https://lcsc.com/product-detail/Multilayer-Ceramic-Capacitors-MLCC---SMD-SMT_PSAProsperity-Dielectrics-PSAProsperity-Dielectrics-FV21N101J102ECG_C565670.html
footprint CAP-0805 (0805 (2012M) Capacitor)
pins: 1, 2

## FV21N120J102ECG
designator C?  Capacitance: 12pF  (hidden comment: *)
Capacitor, Ceramic (MLCC), 12pF, ±5%, 1kV, C0G, ±5%, SMD 0805; Manufacturer: PSA(Prosperity Dielectrics); Manufacturer Part Number: FV21N120J102ECG; Package Size: 0805; JLCPCB Basic Part: No; JLCPCB Part Number: C565671; Supplier 1: LCSC; Category: Capacitors - MLCC; Supplier Part Number 1: C565671; Tolerance: ±5%; Voltage Rating: 1kV; Temperature Coefficient: C0G; RoHS: Yes; ComponentLink1Description: Datasheet; ComponentLink1URL: https://wmsc.lcsc.com/wmsc/upload/file/pdf/v2/lcsc/2304140030_PSA-Prosperity-Dielectrics-FV21N120J102ECG_C565671.pdf; ComponentLink2Description: JLCPCB Part URL; ComponentLink2URL: https://jlcpcb.com/partdetail/C565671; ComponentLink3Description: LCSC Part URL; ComponentLink3URL: https://lcsc.com/product-detail/Multilayer-Ceramic-Capacitors-MLCC---SMD-SMT_PSAProsperity-Dielectrics-PSAProsperity-Dielectrics-FV21N120J102ECG_C565671.html
footprint CAP-0805 (0805 (2012M) Capacitor)
pins: 1, 2

## FV21N150J102ECG
designator C?  Capacitance: 15pF  (hidden comment: *)
Capacitor, Ceramic (MLCC), 15pF, ±5%, 1kV, C0G, ±5%, SMD 0805; Manufacturer: PSA(Prosperity Dielectrics); Manufacturer Part Number: FV21N150J102ECG; Package Size: 0805; JLCPCB Basic Part: No; JLCPCB Part Number: C565672; Supplier 1: LCSC; Category: Capacitors - MLCC; Supplier Part Number 1: C565672; Tolerance: ±5%; Voltage Rating: 1kV; Temperature Coefficient: C0G; RoHS: Yes; ComponentLink1Description: Datasheet; ComponentLink1URL: https://wmsc.lcsc.com/wmsc/upload/file/pdf/v2/lcsc/2304140030_PSA-Prosperity-Dielectrics-FV21N150J102ECG_C565672.pdf; ComponentLink2Description: JLCPCB Part URL; ComponentLink2URL: https://jlcpcb.com/partdetail/C565672; ComponentLink3Description: LCSC Part URL; ComponentLink3URL: https://lcsc.com/product-detail/Multilayer-Ceramic-Capacitors-MLCC---SMD-SMT_PSAProsperity-Dielectrics-PSAProsperity-Dielectrics-FV21N150J102ECG_C565672.html
footprint CAP-0805 (0805 (2012M) Capacitor)
pins: 1, 2

## FV21N180J102ECG
designator C?  Capacitance: 18pF  (hidden comment: *)
Capacitor, Ceramic (MLCC), 18pF, ±5%, 1kV, C0G, ±5%, SMD 0805; Manufacturer: PSA(Prosperity Dielectrics); Manufacturer Part Number: FV21N180J102ECG; Package Size: 0805; JLCPCB Basic Part: No; JLCPCB Part Number: C565673; Supplier 1: LCSC; Category: Capacitors - MLCC; Supplier Part Number 1: C565673; Tolerance: ±5%; Voltage Rating: 1kV; Temperature Coefficient: C0G; RoHS: Yes; ComponentLink1Description: Datasheet; ComponentLink1URL: https://wmsc.lcsc.com/wmsc/upload/file/pdf/v2/lcsc/2304140030_PSA-Prosperity-Dielectrics-FV21N180J102ECG_C565673.pdf; ComponentLink2Description: JLCPCB Part URL; ComponentLink2URL: https://jlcpcb.com/partdetail/C565673; ComponentLink3Description: LCSC Part URL; ComponentLink3URL: https://lcsc.com/product-detail/Multilayer-Ceramic-Capacitors-MLCC---SMD-SMT_PSAProsperity-Dielectrics-PSAProsperity-Dielectrics-FV21N180J102ECG_C565673.html
footprint CAP-0805 (0805 (2012M) Capacitor)
pins: 1, 2

## FV21N220J102ECG
designator C?  Capacitance: 22pF  (hidden comment: *)
Capacitor, Ceramic (MLCC), 22pF, ±5%, 1kV, NP0, ±5%, SMD 0805; Manufacturer: PSA(Prosperity Dielectrics); Manufacturer Part Number: FV21N220J102ECG; Package Size: 0805; JLCPCB Basic Part: No; JLCPCB Part Number: C565674; Supplier 1: LCSC; Category: Capacitors - MLCC; Supplier Part Number 1: C565674; Tolerance: ±5%; Voltage Rating: 1kV; Temperature Coefficient: NP0; RoHS: Yes; ComponentLink1Description: Datasheet; ComponentLink1URL: https://wmsc.lcsc.com/wmsc/upload/file/pdf/v2/lcsc/2304140030_PSA-Prosperity-Dielectrics-FV21N220J102ECG_C565674.pdf; ComponentLink2Description: JLCPCB Part URL; ComponentLink2URL: https://jlcpcb.com/partdetail/C565674; ComponentLink3Description: LCSC Part URL; ComponentLink3URL: https://lcsc.com/product-detail/Multilayer-Ceramic-Capacitors-MLCC---SMD-SMT_PSAProsperity-Dielectrics-PSAProsperity-Dielectrics-FV21N220J102ECG_C565674.html
footprint CAP-0805 (0805 (2012M) Capacitor)
pins: 1, 2

## FV21N270J102ECG
designator C?  Capacitance: 27pF  (hidden comment: *)
Capacitor, Ceramic (MLCC), 27pF, ±5%, 1kV, ±5%, SMD 0805; Manufacturer: PSA(Prosperity Dielectrics); Manufacturer Part Number: FV21N270J102ECG; Package Size: 0805; JLCPCB Basic Part: No; JLCPCB Part Number: C565675; Supplier 1: LCSC; Category: Capacitors - MLCC; Supplier Part Number 1: C565675; Tolerance: ±5%; Voltage Rating: 1kV; RoHS: Yes; ComponentLink1Description: Datasheet; ComponentLink1URL: https://wmsc.lcsc.com/wmsc/upload/file/pdf/v2/lcsc/2304140030_PSA-Prosperity-Dielectrics-FV21N270J102ECG_C565675.pdf; ComponentLink2Description: JLCPCB Part URL; ComponentLink2URL: https://jlcpcb.com/partdetail/C565675; ComponentLink3Description: LCSC Part URL; ComponentLink3URL: https://lcsc.com/product-detail/Multilayer-Ceramic-Capacitors-MLCC---SMD-SMT_PSAProsperity-Dielectrics-PSAProsperity-Dielectrics-FV21N270J102ECG_C565675.html
footprint CAP-0805 (0805 (2012M) Capacitor)
pins: 1, 2

## FV21N330J102ECG
designator C?  Capacitance: 33pF  (hidden comment: *)
Capacitor, Ceramic (MLCC), 33pF, ±5%, 1kV, C0G, ±5%, SMD 0805; Manufacturer: PSA(Prosperity Dielectrics); Manufacturer Part Number: FV21N330J102ECG; Package Size: 0805; JLCPCB Basic Part: No; JLCPCB Part Number: C565676; Supplier 1: LCSC; Category: Capacitors - MLCC; Supplier Part Number 1: C565676; Tolerance: ±5%; Voltage Rating: 1kV; Temperature Coefficient: C0G; RoHS: Yes; ComponentLink1Description: Datasheet; ComponentLink1URL: https://wmsc.lcsc.com/wmsc/upload/file/pdf/v2/lcsc/2304140030_PSA-Prosperity-Dielectrics-FV21N330J102ECG_C565676.pdf; ComponentLink2Description: JLCPCB Part URL; ComponentLink2URL: https://jlcpcb.com/partdetail/C565676; ComponentLink3Description: LCSC Part URL; ComponentLink3URL: https://lcsc.com/product-detail/Multilayer-Ceramic-Capacitors-MLCC---SMD-SMT_PSAProsperity-Dielectrics-PSAProsperity-Dielectrics-FV21N330J102ECG_C565676.html
footprint CAP-0805 (0805 (2012M) Capacitor)
pins: 1, 2

## FV21N390J102ECG
designator C?  Capacitance: 39pF  (hidden comment: *)
Capacitor, Ceramic (MLCC), 39pF, ±5%, 1kV, C0G, ±5%, SMD 0805; Manufacturer: PSA(Prosperity Dielectrics); Manufacturer Part Number: FV21N390J102ECG; Package Size: 0805; JLCPCB Basic Part: No; JLCPCB Part Number: C565677; Supplier 1: LCSC; Category: Capacitors - MLCC; Supplier Part Number 1: C565677; Tolerance: ±5%; Voltage Rating: 1kV; Temperature Coefficient: C0G; RoHS: Yes; ComponentLink1Description: Datasheet; ComponentLink1URL: https://wmsc.lcsc.com/wmsc/upload/file/pdf/v2/lcsc/2304140030_PSA-Prosperity-Dielectrics-FV21N390J102ECG_C565677.pdf; ComponentLink2Description: JLCPCB Part URL; ComponentLink2URL: https://jlcpcb.com/partdetail/C565677; ComponentLink3Description: LCSC Part URL; ComponentLink3URL: https://lcsc.com/product-detail/Multilayer-Ceramic-Capacitors-MLCC---SMD-SMT_PSAProsperity-Dielectrics-PSAProsperity-Dielectrics-FV21N390J102ECG_C565677.html
footprint CAP-0805 (0805 (2012M) Capacitor)
pins: 1, 2

## FV21N470J102ECG
designator C?  Capacitance: 47pF  (hidden comment: *)
Capacitor, Ceramic (MLCC), 47pF, ±5%, 1kV, NP0, ±5%, SMD 0805; Manufacturer: PSA(Prosperity Dielectrics); Manufacturer Part Number: FV21N470J102ECG; Package Size: 0805; JLCPCB Basic Part: No; JLCPCB Part Number: C565678; Supplier 1: LCSC; Category: Capacitors - MLCC; Supplier Part Number 1: C565678; Tolerance: ±5%; Voltage Rating: 1kV; Temperature Coefficient: NP0; RoHS: Yes; ComponentLink1Description: Datasheet; ComponentLink1URL: https://wmsc.lcsc.com/wmsc/upload/file/pdf/v2/lcsc/2304140030_PSA-Prosperity-Dielectrics-FV21N470J102ECG_C565678.pdf; ComponentLink2Description: JLCPCB Part URL; ComponentLink2URL: https://jlcpcb.com/partdetail/C565678; ComponentLink3Description: LCSC Part URL; ComponentLink3URL: https://lcsc.com/product-detail/Multilayer-Ceramic-Capacitors-MLCC---SMD-SMT_PSAProsperity-Dielectrics-PSAProsperity-Dielectrics-FV21N470J102ECG_C565678.html
footprint CAP-0805 (0805 (2012M) Capacitor)
pins: 1, 2

## FV21N560J102ECG
designator C?  Capacitance: 56pF  (hidden comment: *)
Capacitor, Ceramic (MLCC), 56pF, ±5%, 1kV, ±5%, SMD 0805; Manufacturer: PSA(Prosperity Dielectrics); Manufacturer Part Number: FV21N560J102ECG; Package Size: 0805; JLCPCB Basic Part: No; JLCPCB Part Number: C565679; Supplier 1: LCSC; Category: Capacitors - MLCC; Supplier Part Number 1: C565679; Tolerance: ±5%; Voltage Rating: 1kV; RoHS: Yes; ComponentLink1Description: Datasheet; ComponentLink1URL: https://wmsc.lcsc.com/wmsc/upload/file/pdf/v2/lcsc/2304140030_PSA-Prosperity-Dielectrics-FV21N560J102ECG_C565679.pdf; ComponentLink2Description: JLCPCB Part URL; ComponentLink2URL: https://jlcpcb.com/partdetail/C565679; ComponentLink3Description: LCSC Part URL; ComponentLink3URL: https://lcsc.com/product-detail/Multilayer-Ceramic-Capacitors-MLCC---SMD-SMT_PSAProsperity-Dielectrics-PSAProsperity-Dielectrics-FV21N560J102ECG_C565679.html
footprint CAP-0805 (0805 (2012M) Capacitor)
pins: 1, 2

## FV21N680J102ECG
designator C?  Capacitance: 68pF  (hidden comment: *)
Capacitor, Ceramic (MLCC), 68pF, ±5%, 1kV, C0G, ±5%, SMD 0805; Manufacturer: PSA(Prosperity Dielectrics); Manufacturer Part Number: FV21N680J102ECG; Package Size: 0805; JLCPCB Basic Part: No; JLCPCB Part Number: C565680; Supplier 1: LCSC; Category: Capacitors - MLCC; Supplier Part Number 1: C565680; Tolerance: ±5%; Voltage Rating: 1kV; Temperature Coefficient: C0G; RoHS: Yes; ComponentLink1Description: Datasheet; ComponentLink1URL: https://wmsc.lcsc.com/wmsc/upload/file/pdf/v2/lcsc/2304140030_PSA-Prosperity-Dielectrics-FV21N680J102ECG_C565680.pdf; ComponentLink2Description: JLCPCB Part URL; ComponentLink2URL: https://jlcpcb.com/partdetail/C565680; ComponentLink3Description: LCSC Part URL; ComponentLink3URL: https://lcsc.com/product-detail/Multilayer-Ceramic-Capacitors-MLCC---SMD-SMT_PSAProsperity-Dielectrics-PSAProsperity-Dielectrics-FV21N680J102ECG_C565680.html
footprint CAP-0805 (0805 (2012M) Capacitor)
pins: 1, 2

## FV21N820J102ECG
designator C?  Capacitance: 82pF  (hidden comment: *)
Capacitor, Ceramic (MLCC), 82pF, ±5%, 1kV, C0G, ±5%, SMD 0805; Manufacturer: PSA(Prosperity Dielectrics); Manufacturer Part Number: FV21N820J102ECG; Package Size: 0805; JLCPCB Basic Part: No; JLCPCB Part Number: C565681; Supplier 1: LCSC; Category: Capacitors - MLCC; Supplier Part Number 1: C565681; Tolerance: ±5%; Voltage Rating: 1kV; Temperature Coefficient: C0G; RoHS: Yes; ComponentLink1Description: Datasheet; ComponentLink1URL: https://wmsc.lcsc.com/wmsc/upload/file/pdf/v2/lcsc/2304140030_PSA-Prosperity-Dielectrics-FV21N820J102ECG_C565681.pdf; ComponentLink2Description: JLCPCB Part URL; ComponentLink2URL: https://jlcpcb.com/partdetail/C565681; ComponentLink3Description: LCSC Part URL; ComponentLink3URL: https://lcsc.com/product-detail/Multilayer-Ceramic-Capacitors-MLCC---SMD-SMT_PSAProsperity-Dielectrics-PSAProsperity-Dielectrics-FV21N820J102ECG_C565681.html
footprint CAP-0805 (0805 (2012M) Capacitor)
pins: 1, 2

## FV21X102K102PXG
designator C?  Capacitance: 1nF  (hidden comment: *)
Capacitor, Ceramic (MLCC), 1nF, ±10%, 1kV, X7R, ±10%, SMD 0805; Manufacturer: PSA(Prosperity Dielectrics); Manufacturer Part Number: FV21X102K102PXG; Package Size: 0805; JLCPCB Basic Part: No; JLCPCB Part Number: C382207; Supplier 1: LCSC; Category: Capacitors - MLCC; Supplier Part Number 1: C382207; Tolerance: ±10%; Voltage Rating: 1kV; Temperature Coefficient: X7R; RoHS: Yes; ComponentLink1Description: Datasheet; ComponentLink1URL: https://wmsc.lcsc.com/wmsc/upload/file/pdf/v2/lcsc/2304140030_PSA-Prosperity-Dielectrics-FV21X102K102PXG_C382207.pdf; ComponentLink2Description: JLCPCB Part URL; ComponentLink2URL: https://jlcpcb.com/partdetail/C382207; ComponentLink3Description: LCSC Part URL; ComponentLink3URL: https://lcsc.com/product-detail/Multilayer-Ceramic-Capacitors-MLCC---SMD-SMT_PSAProsperity-Dielectrics-PSAProsperity-Dielectrics-FV21X102K102PXG_C382207.html
footprint CAP-0805 (0805 (2012M) Capacitor)
pins: 1, 2

## FV21X103K102ECG
designator C?  Capacitance: 10nF  (hidden comment: *)
Capacitor, Ceramic (MLCC), 10nF, ±10%, 1kV, X7R, ±10%, SMD 0805; Manufacturer: PSA(Prosperity Dielectrics); Manufacturer Part Number: FV21X103K102ECG; Package Size: 0805; JLCPCB Basic Part: No; JLCPCB Part Number: C565682; Supplier 1: LCSC; Category: Capacitors - MLCC; Supplier Part Number 1: C565682; Tolerance: ±10%; Voltage Rating: 1kV; Temperature Coefficient: X7R; RoHS: Yes; ComponentLink1Description: Datasheet; ComponentLink1URL: https://wmsc.lcsc.com/wmsc/upload/file/pdf/v2/lcsc/2304140030_PSA-Prosperity-Dielectrics-FV21X103K102ECG_C565682.pdf; ComponentLink2Description: JLCPCB Part URL; ComponentLink2URL: https://jlcpcb.com/partdetail/C565682; ComponentLink3Description: LCSC Part URL; ComponentLink3URL: https://lcsc.com/product-detail/Multilayer-Ceramic-Capacitors-MLCC---SMD-SMT_PSAProsperity-Dielectrics-PSAProsperity-Dielectrics-FV21X103K102ECG_C565682.html
footprint CAP-0805 (0805 (2012M) Capacitor)
pins: 1, 2

## FV21X222K102ECG
designator C?  Capacitance: 2.2nF  (hidden comment: *)
Capacitor, Ceramic (MLCC), 2.2nF, ±10%, 1kV, X7R, ±10%, SMD 0805; Manufacturer: PSA(Prosperity Dielectrics); Manufacturer Part Number: FV21X222K102ECG; Package Size: 0805; JLCPCB Basic Part: No; JLCPCB Part Number: C565693; Supplier 1: LCSC; Category: Capacitors - MLCC; Supplier Part Number 1: C565693; Tolerance: ±10%; Voltage Rating: 1kV; Temperature Coefficient: X7R; RoHS: Yes; ComponentLink1Description: Datasheet; ComponentLink1URL: https://wmsc.lcsc.com/wmsc/upload/file/pdf/v2/lcsc/2304140030_PSA-Prosperity-Dielectrics-FV21X222K102ECG_C565693.pdf; ComponentLink2Description: JLCPCB Part URL; ComponentLink2URL: https://jlcpcb.com/partdetail/C565693; ComponentLink3Description: LCSC Part URL; ComponentLink3URL: https://lcsc.com/product-detail/Multilayer-Ceramic-Capacitors-MLCC---SMD-SMT_PSAProsperity-Dielectrics-PSAProsperity-Dielectrics-FV21X222K102ECG_C565693.html
footprint CAP-0805 (0805 (2012M) Capacitor)
pins: 1, 2
